# Altium footprint library Connektor.PcbLib: 305 footprints (part 11 of 20)
Each footprint in its own frame and in the unit in brackets; x right, y up, seen from the top. Pads: shape width x height; smd on the part's side, far side on the other; paste and mask are expansions set on the pad; w line width, h text height; cw(c..) or ccw(c..) is an arc to the next point about the centre after c.
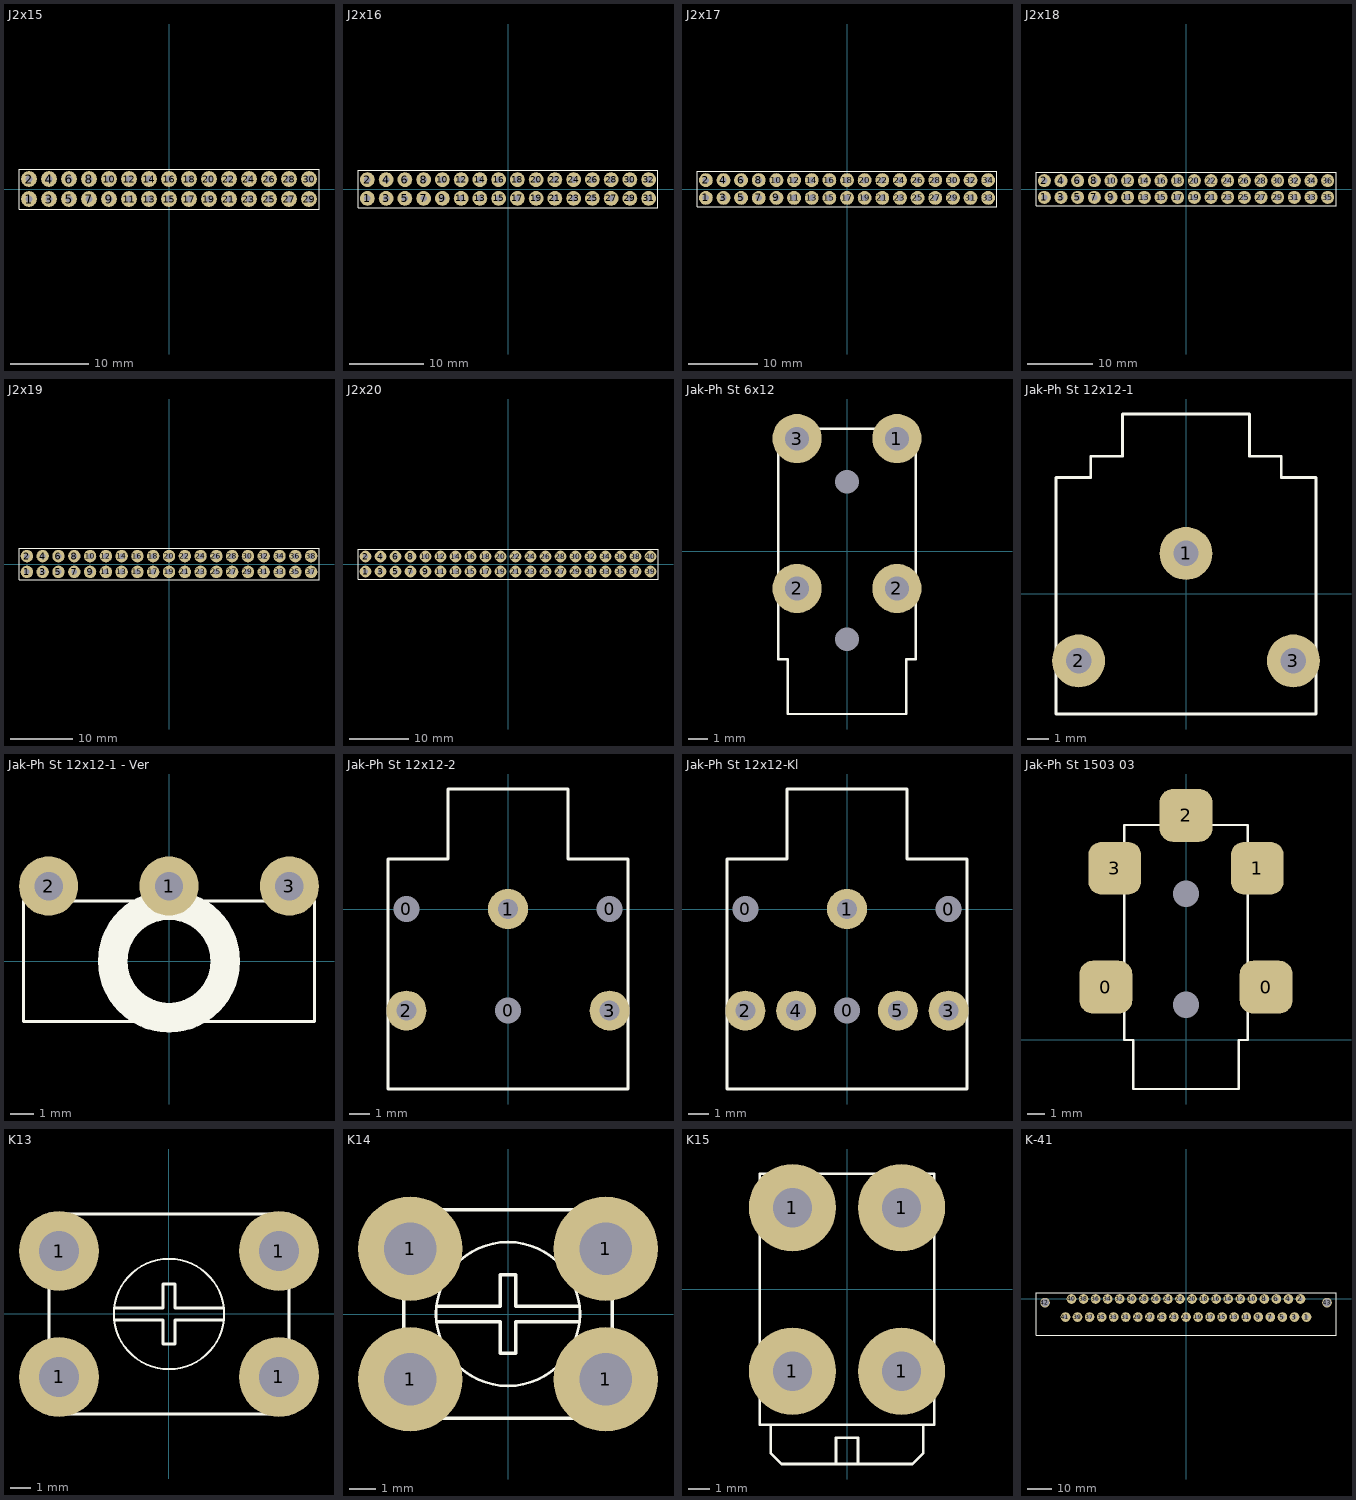
[diagram p10: the footprints below, top view; thin cyan lines are the x and y axes]

## J2x15 [mm]
pads (30):
  round 2 hole 0.9: 1(-17.78,-1.27) 2(-17.78,1.27) 3(-15.24,-1.27) 4(-15.24,1.27) 5(-12.7,-1.27) 6(-12.7,1.27) 7(-10.16,-1.27) 8(-10.16,1.27) 9(-7.62,-1.27) 10(-7.62,1.27) 11(-5.08,-1.27) 12(-5.08,1.27) 13(-2.54,-1.27) 14(-2.54,1.27) 15(0,-1.27) 16(0,1.27) 17(2.54,-1.27) 18(2.54,1.27) 19(5.08,-1.27) 20(5.08,1.27) 21(7.62,-1.27) 22(7.62,1.27) 23(10.16,-1.27) 24(10.16,1.27) 25(12.7,-1.27) 26(12.7,1.27) 27(15.24,-1.27) 28(15.24,1.27) 29(17.78,-1.27) 30(17.78,1.27)
TopOverlay:
  lines w0.127: -19.05,-2.54 19.05,-2.54 19.05,2.54 -19.05,2.54 -19.05,-2.54
3D body: height 10.1, standoff -2.5, extent -19.05,-2.54 19.05,2.54

## J2x16 [mm]
pads (32):
  round 2 hole 0.9: 1(-19.05,-1.27) 2(-19.05,1.27) 3(-16.51,-1.27) 4(-16.51,1.27) 5(-13.97,-1.27) 6(-13.97,1.27) 7(-11.43,-1.27) 8(-11.43,1.27) 9(-8.89,-1.27) 10(-8.89,1.27) 11(-6.35,-1.27) 12(-6.35,1.27) 13(-3.81,-1.27) 14(-3.81,1.27) 15(-1.27,-1.27) 16(-1.27,1.27) 17(1.27,-1.27) 18(1.27,1.27) 19(3.81,-1.27) 20(3.81,1.27) 21(6.35,-1.27) 22(6.35,1.27) 23(8.89,-1.27) 24(8.89,1.27) 25(11.43,-1.27) 26(11.43,1.27) 27(13.97,-1.27) 28(13.97,1.27) 29(16.51,-1.27) 30(16.51,1.27) 31(19.05,-1.27) 32(19.05,1.27)
TopOverlay:
  lines w0.127: -20.32,-2.54 -20.32,2.54 20.32,2.54 20.32,-2.54 -20.32,-2.54
3D body: height 10.1, standoff -2.5, extent -20.32,-2.54 20.32,2.54

## J2x17 [mm]
pads (34):
  round 2 hole 0.9: 1(-20.32,-1.27) 2(-20.32,1.27) 3(-17.78,-1.27) 4(-17.78,1.27) 5(-15.24,-1.27) 6(-15.24,1.27) 7(-12.7,-1.27) 8(-12.7,1.27) 9(-10.16,-1.27) 10(-10.16,1.27) 11(-7.62,-1.27) 12(-7.62,1.27) 13(-5.08,-1.27) 14(-5.08,1.27) 15(-2.54,-1.27) 16(-2.54,1.27) 17(0,-1.27) 18(0,1.27) 19(2.54,-1.27) 20(2.54,1.27) 21(5.08,-1.27) 22(5.08,1.27) 23(7.62,-1.27) 24(7.62,1.27) 25(10.16,-1.27) 26(10.16,1.27) 27(12.7,-1.27) 28(12.7,1.27) 29(15.24,-1.27) 30(15.24,1.27) 31(17.78,-1.27) 32(17.78,1.27) 33(20.32,-1.27) 34(20.32,1.27)
TopOverlay:
  lines w0.127: -21.59,-2.54 21.59,-2.54 21.59,2.54 -21.59,2.54 -21.59,-2.54
3D body: height 10.1, standoff -2.5, extent -21.59,-2.54 21.59,2.54

## J2x18 [mm]
pads (36):
  round 2 hole 0.9: 1(-21.59,-1.27) 2(-21.59,1.27) 3(-19.05,-1.27) 4(-19.05,1.27) 5(-16.51,-1.27) 6(-16.51,1.27) 7(-13.97,-1.27) 8(-13.97,1.27) 9(-11.43,-1.27) 10(-11.43,1.27) 11(-8.89,-1.27) 12(-8.89,1.27) 13(-6.35,-1.27) 14(-6.35,1.27) 15(-3.81,-1.27) 16(-3.81,1.27) 17(-1.27,-1.27) 18(-1.27,1.27) 19(1.27,-1.27) 20(1.27,1.27) 21(3.81,-1.27) 22(3.81,1.27) 23(6.35,-1.27) 24(6.35,1.27) 25(8.89,-1.27) 26(8.89,1.27) 27(11.43,-1.27) 28(11.43,1.27) 29(13.97,-1.27) 30(13.97,1.27) 31(16.51,-1.27) 32(16.51,1.27) 33(19.05,-1.27) 34(19.05,1.27) 35(21.59,-1.27) 36(21.59,1.27)
TopOverlay:
  lines w0.127: -22.86,-2.54 -22.86,2.54 22.86,2.54 22.86,-2.54 -22.86,-2.54
3D body: height 10.1, standoff -2.5, extent -22.86,-2.54 22.86,2.54

## J2x19 [mm]
pads (38):
  round 2 hole 0.9: 1(-22.86,-1.27) 2(-22.86,1.27) 3(-20.32,-1.27) 4(-20.32,1.27) 5(-17.78,-1.27) 6(-17.78,1.27) 7(-15.24,-1.27) 8(-15.24,1.27) 9(-12.7,-1.27) 10(-12.7,1.27) 11(-10.16,-1.27) 12(-10.16,1.27) 13(-7.62,-1.27) 14(-7.62,1.27) 15(-5.08,-1.27) 16(-5.08,1.27) 17(-2.54,-1.27) 18(-2.54,1.27) 19(0,-1.27) 20(0,1.27) 21(2.54,-1.27) 22(2.54,1.27) 23(5.08,-1.27) 24(5.08,1.27) 25(7.62,-1.27) 26(7.62,1.27) 27(10.16,-1.27) 28(10.16,1.27) 29(12.7,-1.27) 30(12.7,1.27) 31(15.24,-1.27) 32(15.24,1.27) 33(17.78,-1.27) 34(17.78,1.27) 35(20.32,-1.27) 36(20.32,1.27) 37(22.86,-1.27) 38(22.86,1.27)
TopOverlay:
  lines w0.127: -24.13,-2.54 24.13,-2.54 24.13,2.54 -24.13,2.54 -24.13,-2.54
3D body: height 10.1, standoff -2.5, extent -24.13,-2.54 24.13,2.54

## J2x20 [mm]
pads (40):
  round 2 hole 0.9: 1(-24.13,-1.27) 2(-24.13,1.27) 3(-21.59,-1.27) 4(-21.59,1.27) 5(-19.05,-1.27) 6(-19.05,1.27) 7(-16.51,-1.27) 8(-16.51,1.27) 9(-13.97,-1.27) 10(-13.97,1.27) 11(-11.43,-1.27) 12(-11.43,1.27) 13(-8.89,-1.27) 14(-8.89,1.27) 15(-6.35,-1.27) 16(-6.35,1.27) 17(-3.81,-1.27) 18(-3.81,1.27) 19(-1.27,-1.27) 20(-1.27,1.27) 21(1.27,-1.27) 22(1.27,1.27) 23(3.81,-1.27) 24(3.81,1.27) 25(6.35,-1.27) 26(6.35,1.27) 27(8.89,-1.27) 28(8.89,1.27) 29(11.43,-1.27) 30(11.43,1.27) 31(13.97,-1.27) 32(13.97,1.27) 33(16.51,-1.27) 34(16.51,1.27) 35(19.05,-1.27) 36(19.05,1.27) 37(21.59,-1.27) 38(21.59,1.27) 39(24.13,-1.27) 40(24.13,1.27)
TopOverlay:
  lines w0.127: -25.4,-2.54 -25.4,2.54 25.4,2.54 25.4,-2.54 -25.4,-2.54
3D body: height 10.1, standoff -2.5, extent -25.4,-2.54 25.4,2.54

## Jak-Ph St 6x12 [mm]
pads (6):
  round 0 hole 1.2 unplated: 0(0,-4.485) 0(0,3.515)
  round 2.5 hole 1.2: 1(2.54,5.715) 2(-2.54,-1.905) 2(2.54,-1.905) 3(-2.54,5.715)
TopOverlay:
  lines w0.127: -3.5,-5.5 -3.5,6.215 3.5,6.215 3.5,-5.5 3,-5.5 3,-8.285 -3,-8.285 -3,-5.5 -3.5,-5.5
3D body: height 6, standoff -2.5, extent -3.5,-8.285 3.5,6.215

## Jak-Ph St 12x12-1 [mm]
pads (3):
  round 2.5 hole 1.2: 1(0,1.905) 2(-5.08,-3.175) 3(5.08,-3.175)
TopOverlay:
  lines w0.127: -6.147,-5.69 -6.147,5.5 -4.5,5.5 -4.5,6.5 -3,6.5 -3,8.5 3,8.5 3,6.5 4.5,6.5 4.5,5.5 6.147,5.5 6.147,-5.69 -6.147,-5.69
3D body: height 6.5, standoff -1.5, extent -6.15,-5.675 6.15,8.625

## Jak-Ph St 12x12-1 - Ver [mm]
pads (3):
  round 2.5 hole 1.2: 1(0,3.175) 2(-5.08,3.175) 3(5.08,3.175)
TopOverlay:
  circle w1.25: c0,0 r2.375
  lines w0.127: -6.147,-2.54 -6.147,2.54 6.147,2.54 6.147,-2.54 -6.147,-2.54
3D body: height 12.3, standoff 0, extent -6.15,-3 6.15,3.5

## Jak-Ph St 12x12-2 [mm]
pads (6):
  round 1.143 hole 1.3 unplated: 0(-5.08,0) 0(0,-5.08) 0(5.08,0)
  round 2 hole 1: 1(0,0) 2(-5.08,-5.08) 3(5.08,-5.08)
TopOverlay:
  lines w0.127: -6,-9 -6,2.5 -3,2.5 -3,6 3,6 3,2.5 6,2.5 6,-9 -6,-9

## Jak-Ph St 12x12-Kl [mm]
pads (8):
  round 1.143 hole 1.3 unplated: 0(-5.08,0) 0(0,-5.08)
  round 1.27 hole 1.3 unplated: 0(5.08,0)
  round 2 hole 1: 1(0,0) 2(-5.08,-5.08) 3(5.08,-5.08) 4(-2.54,-5.08) 5(2.54,-5.08)
TopOverlay:
  lines w0.127: -6,-9 -6,2.5 -3,2.5 -3,6 3,6 3,2.5 6,2.5 6,-9 -6,-9

## Jak-Ph St 1503 03 [mm]
pads (7):
  rrect50% 3x3 smd: 0(-4.55,3) 0(4.55,3) 1(4.05,9.75) 2(0,12.75) 3(-4.05,9.75)
  round 0 hole 1.5 unplated: 0(0,2) 0(0,8.3)
TopOverlay:
  lines w0.127: -3.5,0 -3.5,12.2 3.5,12.2 3.5,0 3,0 3,-2.785 -3,-2.785 -3,0 -3.5,0
3D body: height 6, standoff -2.5, extent -3.5,-2.785 3.5,11.715

## K13 [mm]
pads (4):
  round 4 hole 2: 1(-5.5,-3.15) 1(-5.5,3.15) 1(5.5,-3.15) 1(5.5,3.15)
TopOverlay:
  circle w0.1: c0,0 r2.759
  lines w0.127: -2.7,-0.3 -0.3,-0.3 -0.3,-1.5 0.3,-1.5 0.3,-0.3 2.7,-0.3 ; -2.7,0.3 -0.3,0.3 -0.3,1.5 0.3,1.5 0.3,0.3 2.7,0.3 ; -6,-5 6,-5 6,5 -6,5 -6,-5

## K14 [mm]
pads (4):
  round 4 hole 2: 1(-3.75,-2.5) 1(-3.75,2.5) 1(3.75,-2.5) 1(3.75,2.5)
TopOverlay:
  circle w0.1: c0,0 r2.759
  lines w0.127: -2.7,-0.3 -0.3,-0.3 -0.3,-1.5 0.3,-1.5 0.3,-0.3 2.7,-0.3 ; -2.7,0.3 -0.3,0.3 -0.3,1.5 0.3,1.5 0.3,0.3 2.7,0.3 ; -4,-4 4,-4 4,4 -4,4 -4,-4

## K15 [mm]
pads (4):
  round 4 hole 1.8: 1(-2.5,-3.75) 1(-2.5,3.75) 1(2.5,-3.75) 1(2.5,3.75)
TopOverlay:
  lines w0.127: -3.5,-6.2 -3.5,-7.5 -3,-8 3,-8 3.5,-7.5 3.5,-6.2 ; -0.5,-8 -0.5,-6.8 0.5,-6.8 0.5,-8 ; -4,-6.2 4,-6.2 4,5.3 -4,5.3 -4,-6.2

## K-41 [mm]
pads (43):
  round 4 hole 1.8: 1(50,-7.62) 2(47.5,-0.12) 3(45,-7.62) 4(42.5,-0.12) 5(40,-7.62) 6(37.5,-0.12) 7(35,-7.62) 8(32.5,-0.12) 9(30,-7.62) 10(27.5,-0.12) 11(25,-7.62) 12(22.5,-0.12) 13(20,-7.62) 14(17.5,-0.12) 15(15,-7.62) 16(12.5,-0.12) 17(10,-7.62) 18(7.5,-0.12) 19(5,-7.62) 20(2.5,-0.12) 21(0,-7.62) 22(-2.5,-0.12) 23(-5,-7.62) 24(-7.5,-0.12) 25(-10,-7.62) 26(-12.5,-0.12) 27(-15,-7.62) 28(-17.5,-0.12) 29(-20,-7.62) 30(-22.5,-0.12) 31(-25,-7.62) 32(-27.5,-0.12) 33(-30,-7.62) 34(-32.5,-0.12) 35(-35,-7.62) 36(-37.5,-0.12) 37(-40,-7.62) 38(-42.5,-0.12) 39(-45,-7.62) 40(-47.5,-0.12) 41(-50,-7.62)
  round 4 hole 3.2: 42(-58.5,-1.62) 43(58.5,-1.62)
TopOverlay:
  lines w0.127: -62.23,-15.24 -62.23,2.54 62.23,2.54 62.23,-15.24 -62.165,-15.24